# Altium schematic symbol library Maxim Sensors.SchLib: 1171 symbols (part 41 of 44) (continued)
## MAX11801EWC+ (continued)

## MAX11801EWC+T
designator U?
4 Channels, Ultra-Small, Low-Power, 4-Wire Touch-Sensor Controller with I2C Interface, -40 to 85 degC, 12-Pin BGA (W121A2+1), Pb-Free, Tape and Reel; Generic Part Number: MAX11801; PartNumber: MAX11801EWC+T; Channels: 4; Controller Type: Resistive; EV Kit: Yes; DatasheetVersion: Rev. 3; PackageVersion: Rev. G, 02/2010; PackageReference: W121A2+1; PackageDescription: 12-Pin Wafer-Level Package, Full Array, Body 1.555 x 2.135 mm, Pitch 0.5 mm; Supplier 1: Digi-Key; Supplier Part Number 1: MAX11801EWC+TTR-ND; Supplier 2: Digi-Key; Supplier Part Number 2: MAX11801EWC+TCT-ND; Supplier 3: Digi-Key; Supplier Part Number 3: MAX11801EWC+TDKR-ND; Supplier 4: Farnell; Supplier Part Number 4: 2071893; Supplier 5: Newark; Supplier Part Number 5: 69R7361; Supplier 6: Mouser; Supplier Part Number 6: 700-MAX11801EWC+T; Interface: I2C; Packing: Tape and Reel; Mounting Technology: Surface Mount; ComponentLink1Description: Manufacturer URL; ComponentLink1URL: http://www.maximintegrated.com/; ComponentLink2Description: Datasheet; ComponentLink2URL: http://datasheets.maximintegrated.com/en/ds/MAX11800-MAX11803.pdf; ComponentLink3Description: Package Specification; ComponentLink3URL: http://pdfserv.maximintegrated.com/package_dwgs/21-0009.PDF
footprint MAXM-W121A2+1 (BGA, 12-Balls, Body 2.135x1.555mm, Pitch 0.5mm)
pins: A1 A0 (in) "I2C Address Input Bit 0", A2 AUX (in) "Auxiliary Input", A3 Y+ (io) "Y+ Channel Input/Output", A4 X+ (io) "X+ Channel Input/Output", B1 SCL (in) "I2C Serial Data Clock Input", B2 A1 (in) "I2C Address Input Bit 1", B3 GND (power) "Ground", B4 VDD (power) "Power Supply. Bypass VDD to GND with a 1uF capacitor.", C1 SDA (io) "I2C Serial Data Bus Input/Output", C2 ~{TIRQ} (hiz) "Active-Low Touch Interrupt Output", C3 Y- (io) "Y- Channel Input/Output", C4 X- (io) "X- Channel Input/Output"

## MAX11801GTC/V+
designator U?
4 Channels, Ultra-Small, Low-Power, 4-Wire Touch-Sensor Controller with I2C Interface, -40 to 105 degC, 12-Pin QFN (T1244+4), Pb-Free; Generic Part Number: MAX11801; PartNumber: MAX11801GTC/V+; Channels: 4; Controller Type: Resistive; EV Kit: Yes; DatasheetVersion: Rev. 3; PackageVersion: Rev. L, 04/2012; PackageReference: T1244+4; PackageDescription: 12-Pin Thin Quad Flatpack, No Leads, Body 4 x 4 mm, Pitch 0.8 mm; Supplier 1: Digi-Key; Supplier Part Number 1: MAX11801GTC/V+-ND; Supplier 2: Mouser; Supplier Part Number 2: 700-MAX11801GTC/V+; Interface: I2C; Mounting Technology: Surface Mount; Code_JEDEC: MO-220; ComponentLink1Description: Manufacturer URL; ComponentLink1URL: http://www.maximintegrated.com/; ComponentLink2Description: Datasheet; ComponentLink2URL: http://datasheets.maximintegrated.com/en/ds/MAX11800-MAX11803.pdf; ComponentLink3Description: Package Specification; ComponentLink3URL: http://pdfserv.maximintegrated.com/package_dwgs/21-0139.PDF
footprint MAXM-T1244+4_N (QFN, 12-Leads, Body 4x4mm, Pitch 0.8mm, Thermal Pad 2.1x2.1mm, IPC Medium Density)
footprint MAXM-T1244+4_L (QFN, 12-Leads, Body 4x4mm, Pitch 0.8mm, Thermal Pad 2.1x2.1mm, IPC High Density)
footprint MAXM-T1244+4_M (QFN, 12-Leads, Body 4x4mm, Pitch 0.8mm, Thermal Pad 2.1x2.1mm, IPC Low Density)
pins: 1 X+ (io) "X+ Channel Input/Output", 2 VDD (power) "Power Supply. Bypass VDD to GND with a 1uF capacitor.", 3 GND (power) "Ground", 4 X- (io) "X- Channel Input/Output", 5 Y- (io) "Y- Channel Input/Output", 6 ~{TIRQ} (hiz) "Active-Low Touch Interrupt Output", 7 SDA (io) "I2C Serial Data Bus Input/Output", 8 SCL (in) "I2C Serial Data Clock Input", 9 A0 (in) "I2C Address Input Bit 0", 10 A1 (in) "I2C Address Input Bit 1", 11 AUX (in) "Auxiliary Input", 12 Y+ (io) "Y+ Channel Input/Output", 13 EP (power) "Exposed Pad (TQFN only). Connected to ground."

## MAX11801GTC/V+T
designator U?
4 Channels, Ultra-Small, Low-Power, 4-Wire Touch-Sensor Controller with I2C Interface, -40 to 105 degC, 12-Pin QFN (T1244+4), Pb-Free, Tape and Reel; Generic Part Number: MAX11801; PartNumber: MAX11801GTC/V+T; Channels: 4; Controller Type: Resistive; EV Kit: Yes; DatasheetVersion: Rev. 3; PackageVersion: Rev. L, 04/2012; PackageReference: T1244+4; PackageDescription: 12-Pin Thin Quad Flatpack, No Leads, Body 4 x 4 mm, Pitch 0.8 mm; Supplier 1: Digi-Key; Supplier Part Number 1: MAX11801GTC/V+T-ND; Supplier 2: Mouser; Supplier Part Number 2: 700-MAX11801GTC/V+T; Interface: I2C; Packing: Tape and Reel; Mounting Technology: Surface Mount; Code_JEDEC: MO-220; ComponentLink1Description: Manufacturer URL; ComponentLink1URL: http://www.maximintegrated.com/; ComponentLink2Description: Datasheet; ComponentLink2URL: http://datasheets.maximintegrated.com/en/ds/MAX11800-MAX11803.pdf; ComponentLink3Description: Package Specification; ComponentLink3URL: http://pdfserv.maximintegrated.com/package_dwgs/21-0139.PDF
footprint MAXM-T1244+4_N (QFN, 12-Leads, Body 4x4mm, Pitch 0.8mm, Thermal Pad 2.1x2.1mm, IPC Medium Density)
footprint MAXM-T1244+4_L (QFN, 12-Leads, Body 4x4mm, Pitch 0.8mm, Thermal Pad 2.1x2.1mm, IPC High Density)
footprint MAXM-T1244+4_M (QFN, 12-Leads, Body 4x4mm, Pitch 0.8mm, Thermal Pad 2.1x2.1mm, IPC Low Density)
pins: 1 X+ (io) "X+ Channel Input/Output", 2 VDD (power) "Power Supply. Bypass VDD to GND with a 1uF capacitor.", 3 GND (power) "Ground", 4 X- (io) "X- Channel Input/Output", 5 Y- (io) "Y- Channel Input/Output", 6 ~{TIRQ} (hiz) "Active-Low Touch Interrupt Output", 7 SDA (io) "I2C Serial Data Bus Input/Output", 8 SCL (in) "I2C Serial Data Clock Input", 9 A0 (in) "I2C Address Input Bit 0", 10 A1 (in) "I2C Address Input Bit 1", 11 AUX (in) "Auxiliary Input", 12 Y+ (io) "Y+ Channel Input/Output", 13 EP (power) "Exposed Pad (TQFN only). Connected to ground."

## MAX11802ETC+
designator U?
4 Channels, Low-Power, Ultra Small Resistive Touch-Screen Controller with SPI Interface, -40 to 85 degC, 12-Pin QFN (T1244+4), Pb-Free; Generic Part Number: MAX11802; PartNumber: MAX11802ETC+; Channels: 4; EV Kit: Yes; DatasheetVersion: Rev. 3; PackageVersion: Rev. L, 04/2012; PackageReference: T1244+4; PackageDescription: 12-Pin Thin Quad Flatpack, No Leads, Body 4 x 4 mm, Pitch 0.8 mm; Supplier 1: Digi-Key; Supplier Part Number 1: MAX11802ETC+-ND; Supplier 2: Farnell; Supplier Part Number 2: 2071378; Supplier 3: Newark; Supplier Part Number 3: 27R0848; Supplier 4: Mouser; Supplier Part Number 4: 700-MAX11802ETC+; Controller Type: Resistive; Interface: SPI; Mounting Technology: Surface Mount; Code_JEDEC: MO-220; ComponentLink1Description: Manufacturer URL; ComponentLink1URL: http://www.maximintegrated.com/; ComponentLink2Description: Datasheet; ComponentLink2URL: http://datasheets.maximintegrated.com/en/ds/MAX11800-MAX11803.pdf; ComponentLink3Description: Package Specification; ComponentLink3URL: http://pdfserv.maximintegrated.com/package_dwgs/21-0139.PDF
footprint MAXM-T1244+4_N (QFN, 12-Leads, Body 4x4mm, Pitch 0.8mm, Thermal Pad 2.1x2.1mm, IPC Medium Density)
footprint MAXM-T1244+4_L (QFN, 12-Leads, Body 4x4mm, Pitch 0.8mm, Thermal Pad 2.1x2.1mm, IPC High Density)
footprint MAXM-T1244+4_M (QFN, 12-Leads, Body 4x4mm, Pitch 0.8mm, Thermal Pad 2.1x2.1mm, IPC Low Density)
pins: 1 X+ (io) "X+ Channel Input/Output", 2 VDD (power) "Power Supply. Bypass VDD to GND with a 1uF capacitor.", 3 GND (power) "Ground", 4 X- (io) "X- Channel Input/Output", 5 Y- (io) "Y- Channel Input/Output", 6 ~{TIRQ} (hiz) "Active-Low Touch Interrupt Output", 7 DIN (in) "SPI Serial Data Input", 8 CLK (in) "SPI Serial Data Clock Input", 9 ~{CS} (in) "SPI Chip-Select Input", 10 DOUT (hiz) "SPI Data Output", 11 AUX (in) "Auxiliary Input", 12 Y+ (io) "Y+ Channel Input/Output", 13 EP (power) "Exposed Pad (TQFN only). Connected to ground."

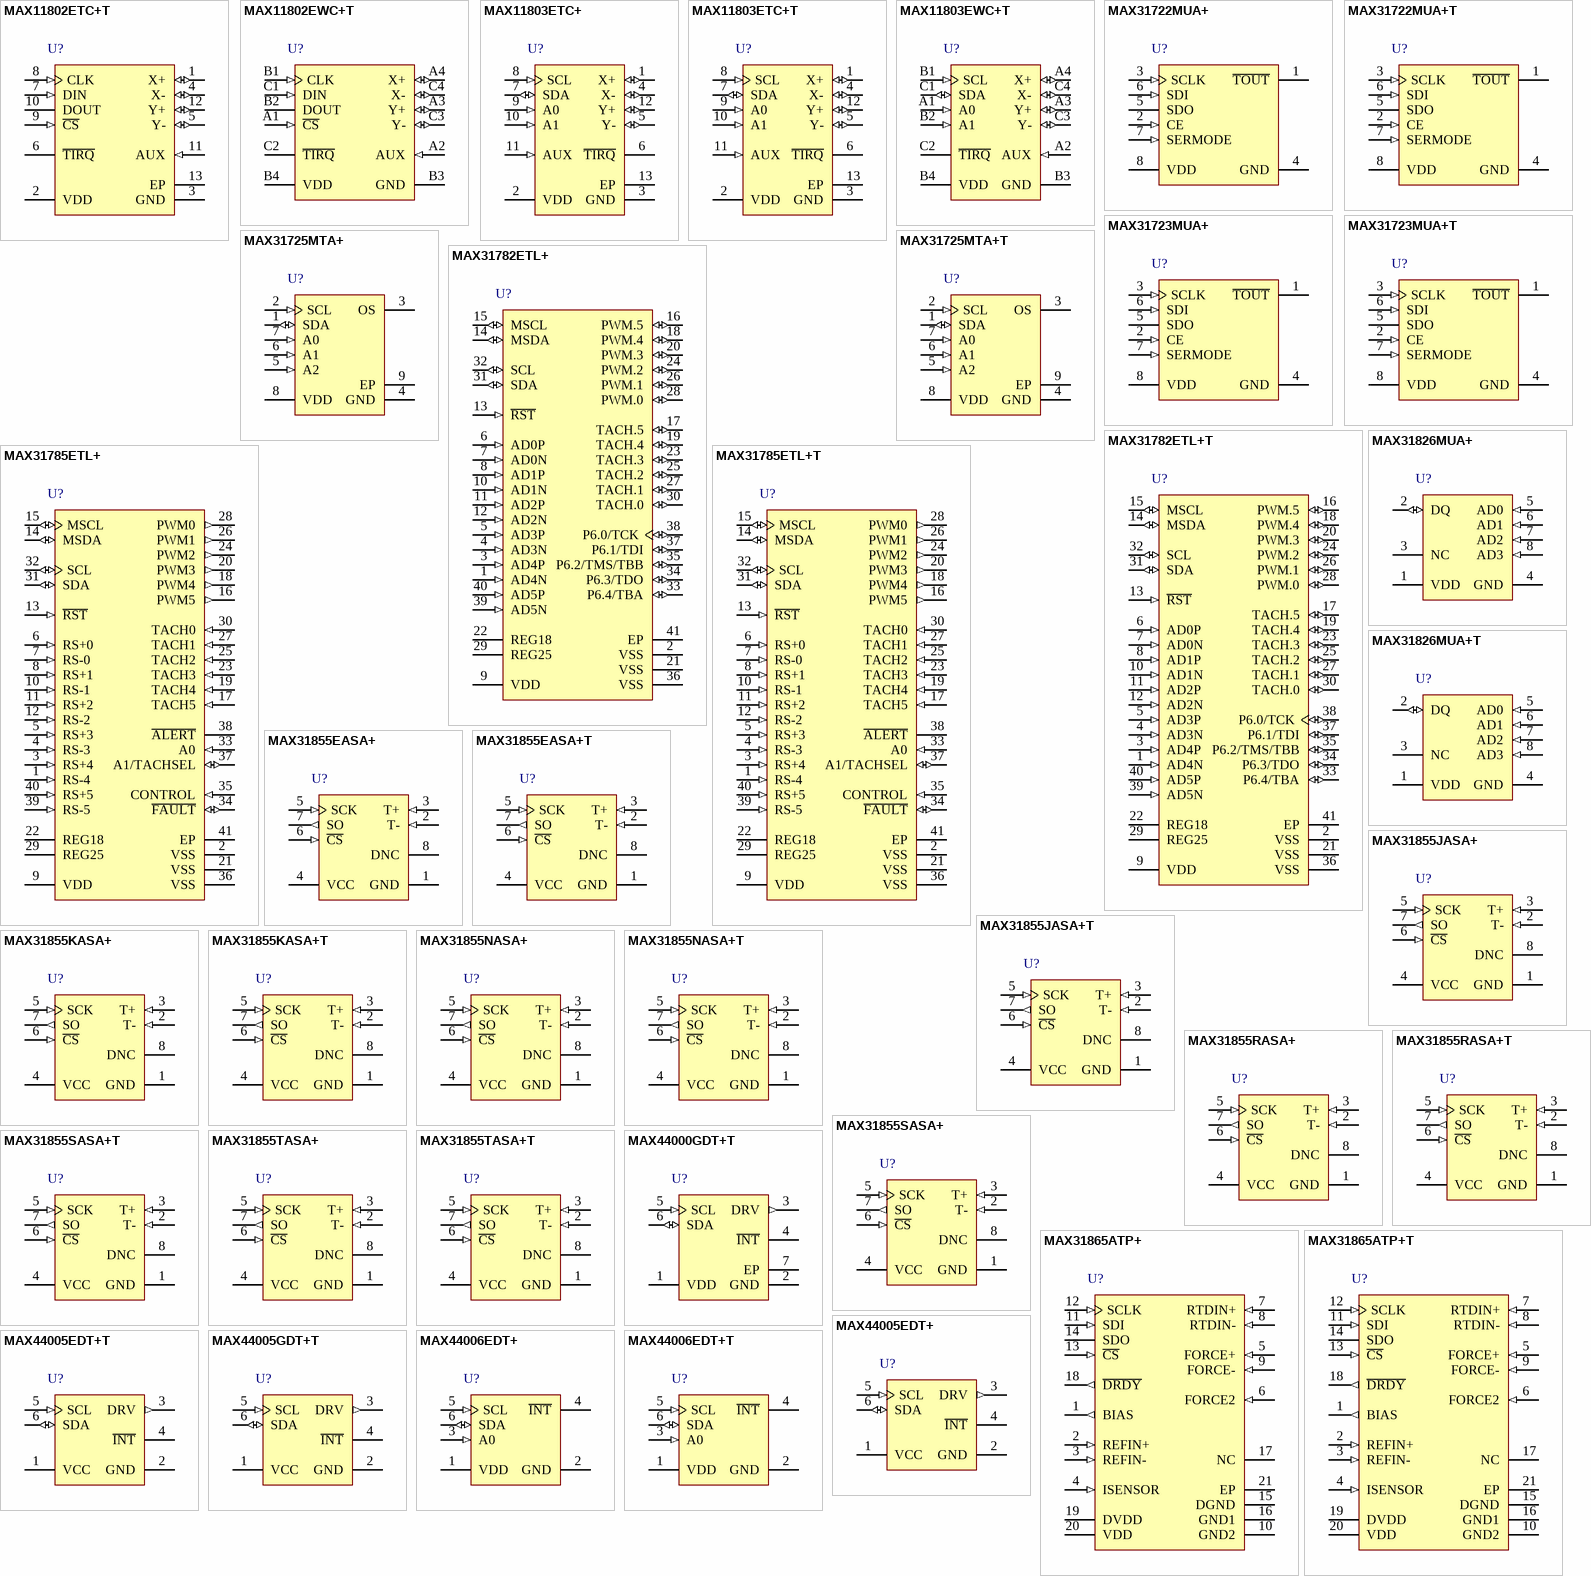
[diagram p31: symbols MAX11802ETC+T to MAX44006EDT+T]

## MAX11802ETC+T
designator U?
4 Channels, Low-Power, Ultra Small Resistive Touch-Screen Controller with SPI Interface, -40 to 85 degC, 12-Pin QFN (T1244+4), Pb-Free, Tape and Reel; Generic Part Number: MAX11802; PartNumber: MAX11802ETC+T; Channels: 4; EV Kit: Yes; DatasheetVersion: Rev. 3; PackageVersion: Rev. L, 04/2012; PackageReference: T1244+4; PackageDescription: 12-Pin Thin Quad Flatpack, No Leads, Body 4 x 4 mm, Pitch 0.8 mm; Supplier 1: Digi-Key; Supplier Part Number 1: MAX11802ETC+T-ND; Supplier 2: Mouser; Supplier Part Number 2: 700-MAX11802ETC+T; Controller Type: Resistive; Interface: SPI; Packing: Tape and Reel; Mounting Technology: Surface Mount; Code_JEDEC: MO-220; ComponentLink1Description: Manufacturer URL; ComponentLink1URL: http://www.maximintegrated.com/; ComponentLink2Description: Datasheet; ComponentLink2URL: http://datasheets.maximintegrated.com/en/ds/MAX11800-MAX11803.pdf; ComponentLink3Description: Package Specification; ComponentLink3URL: http://pdfserv.maximintegrated.com/package_dwgs/21-0139.PDF
footprint MAXM-T1244+4_N (QFN, 12-Leads, Body 4x4mm, Pitch 0.8mm, Thermal Pad 2.1x2.1mm, IPC Medium Density)
footprint MAXM-T1244+4_L (QFN, 12-Leads, Body 4x4mm, Pitch 0.8mm, Thermal Pad 2.1x2.1mm, IPC High Density)
footprint MAXM-T1244+4_M (QFN, 12-Leads, Body 4x4mm, Pitch 0.8mm, Thermal Pad 2.1x2.1mm, IPC Low Density)
pins: 1 X+ (io) "X+ Channel Input/Output", 2 VDD (power) "Power Supply. Bypass VDD to GND with a 1uF capacitor.", 3 GND (power) "Ground", 4 X- (io) "X- Channel Input/Output", 5 Y- (io) "Y- Channel Input/Output", 6 ~{TIRQ} (hiz) "Active-Low Touch Interrupt Output", 7 DIN (in) "SPI Serial Data Input", 8 CLK (in) "SPI Serial Data Clock Input", 9 ~{CS} (in) "SPI Chip-Select Input", 10 DOUT (hiz) "SPI Data Output", 11 AUX (in) "Auxiliary Input", 12 Y+ (io) "Y+ Channel Input/Output", 13 EP (power) "Exposed Pad (TQFN only). Connected to ground."

## MAX11802EWC+T
designator U?
4 Channels, Low-Power, Ultra Small Resistive Touch-Screen Controller with SPI Interface, -40 to 85 degC, 12-Pin BGA (W121A2+1), Pb-Free, Tape and Reel; Generic Part Number: MAX11802; PartNumber: MAX11802EWC+T; Channels: 4; EV Kit: Yes; DatasheetVersion: Rev. 3; PackageVersion: Rev. G, 02/2010; PackageReference: W121A2+1; PackageDescription: 12-Pin Wafer-Level Package, Full Array, Body 1.555 x 2.135 mm, Pitch 0.5 mm; Supplier 1: Digi-Key; Supplier Part Number 1: MAX11802EWC+TTR-ND; Supplier 2: Digi-Key; Supplier Part Number 2: MAX11802EWC+TCT-ND; Supplier 3: Digi-Key; Supplier Part Number 3: MAX11802EWC+TDKR-ND; Supplier 4: Newark; Supplier Part Number 4: 69R7362; Supplier 5: Mouser; Supplier Part Number 5: 700-MAX11802EWC+T; Controller Type: Resistive; Interface: SPI; Packing: Tape and Reel; Mounting Technology: Surface Mount; ComponentLink1Description: Manufacturer URL; ComponentLink1URL: http://www.maximintegrated.com/; ComponentLink2Description: Datasheet; ComponentLink2URL: http://datasheets.maximintegrated.com/en/ds/MAX11800-MAX11803.pdf; ComponentLink3Description: Package Specification; ComponentLink3URL: http://pdfserv.maximintegrated.com/package_dwgs/21-0009.PDF
footprint MAXM-W121A2+1 (BGA, 12-Balls, Body 2.135x1.555mm, Pitch 0.5mm)
pins: A1 ~{CS} (in) "SPI Chip-Select Input", A2 AUX (in) "Auxiliary Input", A3 Y+ (io) "Y+ Channel Input/Output", A4 X+ (io) "X+ Channel Input/Output", B1 CLK (in) "SPI Serial Data Clock Input", B2 DOUT (hiz) "SPI Data Output", B3 GND (power) "Ground", B4 VDD (power) "Power Supply. Bypass VDD to GND with a 1uF capacitor.", C1 DIN (in) "SPI Serial Data Input", C2 ~{TIRQ} (hiz) "Active-Low Touch Interrupt Output", C3 Y- (io) "Y- Channel Input/Output", C4 X- (io) "X- Channel Input/Output"

## MAX11803ETC+
designator U?
4 Channels, Low-Power, Ultra Small Resistive Touch-Screen Controller with SPI Interface, -40 to 85 degC, 12-Pin QFN (T1244+4), Pb-Free; Generic Part Number: MAX11803; PartNumber: MAX11803ETC+; Channels: 4; EV Kit: Yes; Interface: I2C; DatasheetVersion: Rev. 3; PackageVersion: Rev. L, 04/2012; PackageReference: T1244+4; PackageDescription: 12-Pin Thin Quad Flatpack, No Leads, Body 4 x 4 mm, Pitch 0.8 mm; Supplier 1: Digi-Key; Supplier Part Number 1: MAX11803ETC+-ND; Supplier 2: Farnell; Supplier Part Number 2: 2071379; Supplier 3: Newark; Supplier Part Number 3: 27R0851; Supplier 4: Mouser; Supplier Part Number 4: 700-MAX11803ETC+; Controller Type: Resistive; Mounting Technology: Surface Mount; Code_JEDEC: MO-220; ComponentLink1Description: Manufacturer URL; ComponentLink1URL: http://www.maximintegrated.com/; ComponentLink2Description: Datasheet; ComponentLink2URL: http://datasheets.maximintegrated.com/en/ds/MAX11800-MAX11803.pdf; ComponentLink3Description: Package Specification; ComponentLink3URL: http://pdfserv.maximintegrated.com/package_dwgs/21-0139.PDF
footprint MAXM-T1244+4_N (QFN, 12-Leads, Body 4x4mm, Pitch 0.8mm, Thermal Pad 2.1x2.1mm, IPC Medium Density)
footprint MAXM-T1244+4_L (QFN, 12-Leads, Body 4x4mm, Pitch 0.8mm, Thermal Pad 2.1x2.1mm, IPC High Density)
footprint MAXM-T1244+4_M (QFN, 12-Leads, Body 4x4mm, Pitch 0.8mm, Thermal Pad 2.1x2.1mm, IPC Low Density)
pins: 1 X+ (io) "X+ Channel Input/Output", 2 VDD (power) "Power Supply. Bypass VDD to GND with a 1uF capacitor.", 3 GND (power) "Ground", 4 X- (io) "X- Channel Input/Output", 5 Y- (io) "Y- Channel Input/Output", 6 ~{TIRQ} (hiz) "Active-Low Touch Interrupt Output", 7 SDA (io) "I2C Serial Data Bus Input/Output", 8 SCL (in) "I2C Serial Data Clock Input", 9 A0 (in) "I2C Address Input Bit 0", 10 A1 (in) "I2C Address Input Bit 1", 11 AUX (in) "Auxiliary Input", 12 Y+ (io) "Y+ Channel Input/Output", 13 EP (power) "Exposed Pad (TQFN only). Connected to ground."

## MAX11803ETC+T
designator U?
4 Channels, Low-Power, Ultra Small Resistive Touch-Screen Controller with SPI Interface, -40 to 85 degC, 12-Pin QFN (T1244+4), Pb-Free, Tape and Reel; Generic Part Number: MAX11803; PartNumber: MAX11803ETC+T; Channels: 4; EV Kit: Yes; Interface: I2C; DatasheetVersion: Rev. 3; PackageVersion: Rev. L, 04/2012; PackageReference: T1244+4; PackageDescription: 12-Pin Thin Quad Flatpack, No Leads, Body 4 x 4 mm, Pitch 0.8 mm; Supplier 1: Digi-Key; Supplier Part Number 1: MAX11803ETC+T-ND; Supplier 2: Mouser; Supplier Part Number 2: 700-MAX11803ETC+T; Controller Type: Resistive; Packing: Tape and Reel; Mounting Technology: Surface Mount; Code_JEDEC: MO-220; ComponentLink1Description: Manufacturer URL; ComponentLink1URL: http://www.maximintegrated.com/; ComponentLink2Description: Datasheet; ComponentLink2URL: http://datasheets.maximintegrated.com/en/ds/MAX11800-MAX11803.pdf; ComponentLink3Description: Package Specification; ComponentLink3URL: http://pdfserv.maximintegrated.com/package_dwgs/21-0139.PDF
footprint MAXM-T1244+4_N (QFN, 12-Leads, Body 4x4mm, Pitch 0.8mm, Thermal Pad 2.1x2.1mm, IPC Medium Density)
footprint MAXM-T1244+4_L (QFN, 12-Leads, Body 4x4mm, Pitch 0.8mm, Thermal Pad 2.1x2.1mm, IPC High Density)
footprint MAXM-T1244+4_M (QFN, 12-Leads, Body 4x4mm, Pitch 0.8mm, Thermal Pad 2.1x2.1mm, IPC Low Density)
pins: 1 X+ (io) "X+ Channel Input/Output", 2 VDD (power) "Power Supply. Bypass VDD to GND with a 1uF capacitor.", 3 GND (power) "Ground", 4 X- (io) "X- Channel Input/Output", 5 Y- (io) "Y- Channel Input/Output", 6 ~{TIRQ} (hiz) "Active-Low Touch Interrupt Output", 7 SDA (io) "I2C Serial Data Bus Input/Output", 8 SCL (in) "I2C Serial Data Clock Input", 9 A0 (in) "I2C Address Input Bit 0", 10 A1 (in) "I2C Address Input Bit 1", 11 AUX (in) "Auxiliary Input", 12 Y+ (io) "Y+ Channel Input/Output", 13 EP (power) "Exposed Pad (TQFN only). Connected to ground."

## MAX11803EWC+T
designator U?
4 Channels, Low-Power, Ultra Small Resistive Touch-Screen Controller with SPI Interface, -40 to 85 degC, 12-Pin BGA (W121A2+1), Pb-Free, Tape and Reel; Generic Part Number: MAX11803; PartNumber: MAX11803EWC+T; Channels: 4; EV Kit: Yes; Interface: I2C; DatasheetVersion: Rev. 3; PackageVersion: Rev. G, 02/2010; PackageReference: W121A2+1; PackageDescription: 12-Pin Wafer-Level Package, Full Array, Body 1.555 x 2.135 mm, Pitch 0.5 mm; Supplier 1: Digi-Key; Supplier Part Number 1: MAX11803EWC+TTR-ND; Supplier 2: Digi-Key; Supplier Part Number 2: MAX11803EWC+TCT-ND; Supplier 3: Digi-Key; Supplier Part Number 3: MAX11803EWC+TDKR-ND; Supplier 4: Newark; Supplier Part Number 4: 69R7363; Supplier 5: Mouser; Supplier Part Number 5: 700-MAX11803EWC+T; Controller Type: Resistive; Packing: Tape and Reel; Mounting Technology: Surface Mount; ComponentLink1Description: Manufacturer URL; ComponentLink1URL: http://www.maximintegrated.com/; ComponentLink2Description: Datasheet; ComponentLink2URL: http://datasheets.maximintegrated.com/en/ds/MAX11800-MAX11803.pdf; ComponentLink3Description: Package Specification; ComponentLink3URL: http://pdfserv.maximintegrated.com/package_dwgs/21-0009.PDF
footprint MAXM-W121A2+1 (BGA, 12-Balls, Body 2.135x1.555mm, Pitch 0.5mm)
pins: A1 A0 (in) "I2C Address Input Bit 0", A2 AUX (in) "Auxiliary Input", A3 Y+ (io) "Y+ Channel Input/Output", A4 X+ (io) "X+ Channel Input/Output", B1 SCL (in) "I2C Serial Data Clock Input", B2 A1 (in) "I2C Address Input Bit 1", B3 GND (power) "Ground", B4 VDD (power) "Power Supply. Bypass VDD to GND with a 1uF capacitor.", C1 SDA (io) "I2C Serial Data Bus Input/Output", C2 ~{TIRQ} (hiz) "Active-Low Touch Interrupt Output", C3 Y- (io) "Y- Channel Input/Output", C4 X- (io) "X- Channel Input/Output"

## MAX31722MUA+
designator U?
Digital Thermometers and Thermostats with SPI / 3-Wire Interface, 12 Bits Temperature Resolution, -55 to 125 degC, 8-Pin SOP (U8+1), Pb-Free; Generic Part Number: MAX31722; PartNumber: MAX31722MUA+; Alarm Output: Overt; Functions: Memory, Single Temperature Alarm ,Standalone Thermostat; Interface: 3-Wire/SPI, 3-Wire; Parasite Pwr.: No; DatasheetVersion: Rev. 0; PackageVersion: Rev. L, 08/2009; PackageReference: U8+1; PackageDescription: 8-Pin Micro-MAX, Thin Shrink Small-Outline (U8+1), Body 3 x 3 mm, Pitch 0.65 mm; Supplier 1: Digi-Key; Supplier Part Number 1: MAX31722MUA+-ND; Supplier 2: Farnell; Supplier Part Number 2: 2212248; Supplier 3: Newark; Supplier Part Number 3: 45W6313; Supplier 4: Mouser; Supplier Part Number 4: 700-MAX31722MUA+; Mounting Technology: Surface Mount; Code_JEDEC: MO-187; ComponentLink1Description: Manufacturer URL; ComponentLink1URL: http://www.maximintegrated.com/; ComponentLink2Description: Datasheet; ComponentLink2URL: http://datasheets.maximintegrated.com/en/ds/MAX31722-MAX31723.pdf; ComponentLink3Description: Package Specification; ComponentLink3URL: http://pdfserv.maximintegrated.com/package_dwgs/21-0036.PDF
footprint MAXM-U8+1_N (SOP, 8-Leads, Body 3x3mm, Pitch 0.65mm, IPC Medium Density)
footprint MAXM-U8+1_L (SOP, 8-Leads, Body 3x3mm, Pitch 0.65mm, IPC High Density)
footprint MAXM-U8+1_M (SOP, 8-Leads, Body 3x3mm, Pitch 0.65mm, IPC Low Density)
pins: 1 ~{TOUT} (oc) "Thermostat Output. Open-drain output indicator for internal thermal alarm limits.", 2 CE (in) "Chip Enable. Must be asserted high for communication to take place for either the SPI or 3-wire interfaces.", 3 SCLK (in) "Serial-Clock Input. Used to synchronize data movement on the serial interface for either SPI or 3-wire interfaces.", 4 GND (power) "Ground. Ground connection.", 5 SDO (hiz) "Serial-Data Output. When SPI communication is selected, the SDO pin is the serial-data output for the SPI bus. When 3-wire communication is selected, this pin must be connected to the SDI pin. The SDI and SDO pins function (See Datasheet)", 6 SDI (in) "Serial-Data Input. When SPI communication is selected, the SDI pin is the serial-data input for the SPI bus. When 3-wire communication is selected, this pin must be connected to the SDO pin. The SDI and SDO pins function as (See Datasheet)", 7 SERMODE (in) "Serial-Interface Mode Input. This pin selects which interface is used. When connected to VDD, SPI communication is selected. When connected to GND, 3-wire communication is selected.", 8 VDD (power) "Supply Voltage. Power-supply input."

## MAX31722MUA+T
designator U?
Digital Thermometers and Thermostats with SPI / 3-Wire Interface, 12 Bits Temperature Resolution, -55 to 125 degC, 8-Pin SOP (U8+1), Pb-Free, Tape and Reel; Generic Part Number: MAX31722; PartNumber: MAX31722MUA+T; Alarm Output: Overt; Functions: Memory, Single Temperature Alarm ,Standalone Thermostat; Interface: 3-Wire/SPI, 3-Wire; Parasite Pwr.: No; DatasheetVersion: Rev. 0; PackageVersion: Rev. L, 08/2009; PackageReference: U8+1; PackageDescription: 8-Pin Micro-MAX, Thin Shrink Small-Outline (U8+1), Body 3 x 3 mm, Pitch 0.65 mm; Supplier 1: Digi-Key; Supplier Part Number 1: MAX31722MUA+TTR-ND; Supplier 2: Digi-Key; Supplier Part Number 2: MAX31722MUA+TCT-ND; Supplier 3: Digi-Key; Supplier Part Number 3: MAX31722MUA+TDKR-ND; Supplier 4: Mouser; Supplier Part Number 4: 700-MAX31722MUA+T; Packing: Tape and Reel; Mounting Technology: Surface Mount; Code_JEDEC: MO-187; ComponentLink1Description: Manufacturer URL; ComponentLink1URL: http://www.maximintegrated.com/; ComponentLink2Description: Datasheet; ComponentLink2URL: http://datasheets.maximintegrated.com/en/ds/MAX31722-MAX31723.pdf; ComponentLink3Description: Package Specification; ComponentLink3URL: http://pdfserv.maximintegrated.com/package_dwgs/21-0036.PDF
footprint MAXM-U8+1_N (SOP, 8-Leads, Body 3x3mm, Pitch 0.65mm, IPC Medium Density)
footprint MAXM-U8+1_L (SOP, 8-Leads, Body 3x3mm, Pitch 0.65mm, IPC High Density)
footprint MAXM-U8+1_M (SOP, 8-Leads, Body 3x3mm, Pitch 0.65mm, IPC Low Density)
pins: 1 ~{TOUT} (oc) "Thermostat Output. Open-drain output indicator for internal thermal alarm limits.", 2 CE (in) "Chip Enable. Must be asserted high for communication to take place for either the SPI or 3-wire interfaces.", 3 SCLK (in) "Serial-Clock Input. Used to synchronize data movement on the serial interface for either SPI or 3-wire interfaces.", 4 GND (power) "Ground. Ground connection.", 5 SDO (hiz) "Serial-Data Output. When SPI communication is selected, the SDO pin is the serial-data output for the SPI bus. When 3-wire communication is selected, this pin must be connected to the SDI pin. The SDI and SDO pins function (See Datasheet)", 6 SDI (in) "Serial-Data Input. When SPI communication is selected, the SDI pin is the serial-data input for the SPI bus. When 3-wire communication is selected, this pin must be connected to the SDO pin. The SDI and SDO pins function as (See Datasheet)", 7 SERMODE (in) "Serial-Interface Mode Input. This pin selects which interface is used. When connected to VDD, SPI communication is selected. When connected to GND, 3-wire communication is selected.", 8 VDD (power) "Supply Voltage. Power-supply input."

## MAX31723MUA+
designator U?
Digital Thermometers and Thermostats with SPI / 3-Wire Interface, 12 Bits Temperature Resolution, -55 to 125 degC, 8-Pin SOP (U8+1), Pb-Free; Generic Part Number: MAX31723; PartNumber: MAX31723MUA+; Alarm Output: Overt; Functions: Memory, Single Temperature Alarm ,Standalone Thermostat; Interface: 3-Wire/SPI, 3-Wire; Parasite Pwr.: No; DatasheetVersion: Rev. 0; PackageVersion: Rev. L, 08/2009; PackageReference: U8+1; PackageDescription: 8-Pin Micro-MAX, Thin Shrink Small-Outline (U8+1), Body 3 x 3 mm, Pitch 0.65 mm; Supplier 1: Digi-Key; Supplier Part Number 1: MAX31723MUA+-ND; Supplier 2: Farnell; Supplier Part Number 2: 2212251; Supplier 3: Newark; Supplier Part Number 3: 45W6314; Supplier 4: Mouser; Supplier Part Number 4: 700-MAX31723MUA+; Mounting Technology: Surface Mount; Code_JEDEC: MO-187; ComponentLink1Description: Manufacturer URL; ComponentLink1URL: http://www.maximintegrated.com/; ComponentLink2Description: Datasheet; ComponentLink2URL: http://datasheets.maximintegrated.com/en/ds/MAX31722-MAX31723.pdf; ComponentLink3Description: Package Specification; ComponentLink3URL: http://pdfserv.maximintegrated.com/package_dwgs/21-0036.PDF
footprint MAXM-U8+1_N (SOP, 8-Leads, Body 3x3mm, Pitch 0.65mm, IPC Medium Density)
footprint MAXM-U8+1_L (SOP, 8-Leads, Body 3x3mm, Pitch 0.65mm, IPC High Density)
footprint MAXM-U8+1_M (SOP, 8-Leads, Body 3x3mm, Pitch 0.65mm, IPC Low Density)
pins: 1 ~{TOUT} (oc) "Thermostat Output. Open-drain output indicator for internal thermal alarm limits.", 2 CE (in) "Chip Enable. Must be asserted high for communication to take place for either the SPI or 3-wire interfaces.", 3 SCLK (in) "Serial-Clock Input. Used to synchronize data movement on the serial interface for either SPI or 3-wire interfaces.", 4 GND (power) "Ground. Ground connection.", 5 SDO (hiz) "Serial-Data Output. When SPI communication is selected, the SDO pin is the serial-data output for the SPI bus. When 3-wire communication is selected, this pin must be connected to the SDI pin. The SDI and SDO pins function (See Datasheet)", 6 SDI (in) "Serial-Data Input. When SPI communication is selected, the SDI pin is the serial-data input for the SPI bus. When 3-wire communication is selected, this pin must be connected to the SDO pin. The SDI and SDO pins function as (See Datasheet)", 7 SERMODE (in) "Serial-Interface Mode Input. This pin selects which interface is used. When connected to VDD, SPI communication is selected. When connected to GND, 3-wire communication is selected.", 8 VDD (power) "Supply Voltage. Power-supply input."

## MAX31723MUA+T
designator U?
Digital Thermometers and Thermostats with SPI / 3-Wire Interface, 12 Bits Temperature Resolution, -55 to 125 degC, 8-Pin SOP (U8+1), Pb-Free, Tape ang Reel; Generic Part Number: MAX31723; PartNumber: MAX31723MUA+T; Alarm Output: Overt; Functions: Memory, Single Temperature Alarm ,Standalone Thermostat; Interface: 3-Wire/SPI, 3-Wire; Parasite Pwr.: No; DatasheetVersion: Rev. 0; PackageVersion: Rev. L, 08/2009; PackageReference: U8+1; PackageDescription: 8-Pin Micro-MAX, Thin Shrink Small-Outline (U8+1), Body 3 x 3 mm, Pitch 0.65 mm; Supplier 1: Digi-Key; Supplier Part Number 1: MAX31723MUA+TTR-ND; Supplier 2: Digi-Key; Supplier Part Number 2: MAX31723MUA+TCT-ND; Supplier 3: Digi-Key; Supplier Part Number 3: MAX31723MUA+TDKR-ND; Supplier 4: Mouser; Supplier Part Number 4: 700-MAX31723MUA+T; Packing: Tape ang Reel; Mounting Technology: Surface Mount; Code_JEDEC: MO-187; ComponentLink1Description: Manufacturer URL; ComponentLink1URL: http://www.maximintegrated.com/; ComponentLink2Description: Datasheet; ComponentLink2URL: http://datasheets.maximintegrated.com/en/ds/MAX31722-MAX31723.pdf; ComponentLink3Description: Package Specification; ComponentLink3URL: http://pdfserv.maximintegrated.com/package_dwgs/21-0036.PDF
footprint MAXM-U8+1_N (SOP, 8-Leads, Body 3x3mm, Pitch 0.65mm, IPC Medium Density)
footprint MAXM-U8+1_L (SOP, 8-Leads, Body 3x3mm, Pitch 0.65mm, IPC High Density)
footprint MAXM-U8+1_M (SOP, 8-Leads, Body 3x3mm, Pitch 0.65mm, IPC Low Density)
pins: 1 ~{TOUT} (oc) "Thermostat Output. Open-drain output indicator for internal thermal alarm limits.", 2 CE (in) "Chip Enable. Must be asserted high for communication to take place for either the SPI or 3-wire interfaces.", 3 SCLK (in) "Serial-Clock Input. Used to synchronize data movement on the serial interface for either SPI or 3-wire interfaces.", 4 GND (power) "Ground. Ground connection.", 5 SDO (hiz) "Serial-Data Output. When SPI communication is selected, the SDO pin is the serial-data output for the SPI bus. When 3-wire communication is selected, this pin must be connected to the SDI pin. The SDI and SDO pins function (See Datasheet)", 6 SDI (in) "Serial-Data Input. When SPI communication is selected, the SDI pin is the serial-data input for the SPI bus. When 3-wire communication is selected, this pin must be connected to the SDO pin. The SDI and SDO pins function as (See Datasheet)", 7 SERMODE (in) "Serial-Interface Mode Input. This pin selects which interface is used. When connected to VDD, SPI communication is selected. When connected to GND, 3-wire communication is selected.", 8 VDD (power) "Supply Voltage. Power-supply input."

## MAX31725MTA+
designator U?
+ / -0.5 degC Local I2C Temperature Sensor, 16 Bits Temperature Resolution, -55 to 150 degC, 8-Pin SON (T833+2), Pb-Free; Generic Part Number: MAX31725; PartNumber: MAX31725MTA+; Alarm Output: Overt; Interface: 2-Wire/I2C/SMBus; Multi Droppable: Yes; Parasite Pwr.: No; DatasheetVersion: Rev. 0; PackageVersion: Rev. J, 08/2009; PackageReference: T833+2; PackageDescription: 8-Pin Plastic Very Very Thin Dual Flatpack No Leads, Exposed Pad (T833+2); Supplier 1: Digi-Key; Supplier Part Number 1: MAX31725MTA+-ND; Supplier 2: Mouser; Supplier Part Number 2: 700-MAX31725MTA+; Mounting Technology: Surface Mount; Code_JEDEC: MO229; ComponentLink1Description: Manufacturer URL; ComponentLink1URL: http://www.maximintegrated.com/; ComponentLink2Description: Datasheet; ComponentLink2URL: http://datasheets.maximintegrated.com/en/ds/MAX31725.pdf; ComponentLink3Description: Package Specification; ComponentLink3URL: http://pdfserv.maximintegrated.com/package_dwgs/21-0137.PDF
footprint MAXM-T833+2_V (SON, 8-Leads, Body 3x3 mm, Pitch 0.65mm, Thermal Pad 2.3x1.5mm)
pins: 1 SDA (io) "Serial-Data Input/Output Line. Open drain. Connect SDA to a pullup resistor. High impedance for supply voltages from 0 to 3.7V.", 2 SCL (in) "Serial-Data Clock Input. Open drain. Connect SCL to a pullup resistor. High impedance for supply voltages from 0 to 3.7V.", 3 OS (oc) "Overtemperature Shutdown Output. Open drain. Connect OS to a pullup resistor.", 4 GND (power) "Ground", 5 A2 (in) "I2C Slave Address Input. Connect A2 to GND or VDD to set the desired I2C bus address. Do not leave unconnected (Table 1).", 6 A1 (in) "I2C Slave Address Input. Connect A1 to GND, VDD, SDA, or SCL to set the desired I2C bus address. Do not leave unconnected (Table 1). High impedance for supply voltages from 0 to 3.7V.", 7 A0 (in) "I2C Slave Address Input. Connect A0 to GND, VDD, SDA, or SCL to set the desired I2C bus address. Do not leave unconnected (Table 1). High impedance for supply voltages from 0 to 3.7V.", 8 VDD (power) "Positive Supply Voltage Input. Bypass to GND with a 0.1uF bypass capacitor.", 9 EP (power) "Exposed Pad (Bottom Side of Package). Connect EP to GND."

## MAX31725MTA+T
designator U?
+ / -0.5 degC Local I2C Temperature Sensor, 16 Bits Temperature Resolution, -55 to 125 degC, 8-Pin SON (T833+2), Pb-Free, Tape and Reel; Generic Part Number: MAX31725; PartNumber: MAX31725MTA+T; Alarm Output: Overt; Interface: 2-Wire/I2C/SMBus; Multi Droppable: Yes; Parasite Pwr.: No; DatasheetVersion: Rev. 0; PackageVersion: Rev. J, 08/2009; PackageReference: T833+2; PackageDescription: 8-Pin Plastic Very Very Thin Dual Flatpack No Leads, Exposed Pad (T833+2); Supplier 1: Digi-Key; Supplier Part Number 1: MAX31725MTA+T-ND; Supplier 2: Mouser; Supplier Part Number 2: 700-MAX31725MTA+T; Packing: Tape and Reel; Mounting Technology: Surface Mount; Code_JEDEC: MO229; ComponentLink1Description: Manufacturer URL; ComponentLink1URL: http://www.maximintegrated.com/; ComponentLink2Description: Datasheet; ComponentLink2URL: http://datasheets.maximintegrated.com/en/ds/MAX31725.pdf; ComponentLink3Description: Package Specification; ComponentLink3URL: http://pdfserv.maximintegrated.com/package_dwgs/21-0137.PDF
footprint MAXM-T833+2_V (SON, 8-Leads, Body 3x3 mm, Pitch 0.65mm, Thermal Pad 2.3x1.5mm)
pins: 1 SDA (io) "Serial-Data Input/Output Line. Open drain. Connect SDA to a pullup resistor. High impedance for supply voltages from 0 to 3.7V.", 2 SCL (in) "Serial-Data Clock Input. Open drain. Connect SCL to a pullup resistor. High impedance for supply voltages from 0 to 3.7V.", 3 OS (oc) "Overtemperature Shutdown Output. Open drain. Connect OS to a pullup resistor.", 4 GND (power) "Ground", 5 A2 (in) "I2C Slave Address Input. Connect A2 to GND or VDD to set the desired I2C bus address. Do not leave unconnected (Table 1).", 6 A1 (in) "I2C Slave Address Input. Connect A1 to GND, VDD, SDA, or SCL to set the desired I2C bus address. Do not leave unconnected (Table 1). High impedance for supply voltages from 0 to 3.7V.", 7 A0 (in) "I2C Slave Address Input. Connect A0 to GND, VDD, SDA, or SCL to set the desired I2C bus address. Do not leave unconnected (Table 1). High impedance for supply voltages from 0 to 3.7V.", 8 VDD (power) "Positive Supply Voltage Input. Bypass to GND with a 0.1uF bypass capacitor.", 9 EP (power) "Exposed Pad (Bottom Side of Package). Connect EP to GND."

## MAX31782ETL+
designator U?
System Management Microcontroller, -40 to 85 degC, 40-Pin QFN (T4066+2), Pb-Free; Generic Part Number: MAX31782; PartNumber: MAX31782ETL+; Fan Cntrl.: PWM; Fan Controller Functions: Fan Failure Detector, Remote & Local Sensor; Interface: 2-Wire/I2C/SMBus, JTAG; DatasheetVersion: Rev. 2; PackageVersion: Rev. M, 03/2012; PackageReference: T4066+2; PackageDescription: 40-Pin Thin Quad Flatpack, No Leads, Body 6 x 6 mm, Pitch 0.5 mm; Supplier 1: Digi-Key; Supplier Part Number 1: MAX31782ETL+-ND; Supplier 2: Mouser; Supplier Part Number 2: 700-MAX31782ETL+; Mounting Technology: Surface Mount; Code_JEDEC: MO-220; ComponentLink1Description: Manufacturer URL; ComponentLink1URL: http://www.maximintegrated.com/; ComponentLink2Description: Datasheet; ComponentLink2URL: http://datasheets.maximintegrated.com/en/ds/MAX31782.pdf; ComponentLink3Description: Package Specification; ComponentLink3URL: http://pdfserv.maximintegrated.com/package_dwgs/21-0141.PDF
footprint MAXM-T4066+2_N (QFN, 40-Leads, Body 6x6mm, Pitch 0.5mm, Thermal Pad 4.1x4.1mm, IPC Medium Density)
footprint MAXM-T4066+2_L (QFN, 40-Leads, Body 6x6mm, Pitch 0.5mm, Thermal Pad 4.1x4.1mm, IPC High Density)
footprint MAXM-T4066+2_M (QFN, 40-Leads, Body 6x6mm, Pitch 0.5mm, Thermal Pad 4.1x4.1mm, IPC Low Density)
pins: 1 AD4N (in) "Ground Reference for ADC.4 Voltage Measurement", 2 VSS (power) "Supply Return Node", 3 AD4P (in) "ADC Voltage-Sense Input, Measurement Relative to AD4N", 4 AD3N (in) "Ground Reference for ADC.3 Voltage Measurement. Connected to external reference pin when enabled.", 5 AD3P (in) "ADC Voltage-Sense Input, Measurement Relative to AD3N", 6 AD0P (in) "ADC Voltage-Sense Input, Measurement Relative to AD0N", 7 AD0N (in) "Ground Reference for ADC.0 Voltage Measurement", 8 AD1P (in) "ADC Voltage-Sense Input, Measurement Relative to AD1N", 9 VDD (power) "Input Supply. +2.7V to +5.5V input range. Bypass VDD to VSS with a 0.1uF capacitor.", 10 AD1N (in) "Ground Reference for ADC.1 Voltage Measurement", 11 AD2P (in) "ADC Voltage-Sense Input, Measurement Relative to AD2N", 12 AD2N (in) "Ground Reference for ADC.2 Voltage Measurement", 13 ~{RST} (in) "Active-Low Reset. A low-level voltage at this pin resets the IC.", 14 MSDA (io) "Master I2C-Compatible Bidirectional Data Line. When disabled, this pin can be used as GPIO P2.7.", 15 MSCL (io) "Master I2C-Compatible Clock. When disabled, this pin can be used as GPIO P2.6.", 16 PWM.5 (io) "PWM Output No. 5. When disabled, this pin can be used as GPIO.", 17 TACH.5 (io) "Tachometer Input No. 5. When disabled, this pin can be used as GPIO.", 18 PWM.4 (io) "PWM Output No. 4. When disabled, this pin can be used as GPIO.", 19 TACH.4 (io) "Tachometer Input No. 4. When disabled, this pin can be used as GPIO.", 20 PWM.3 (io) "PWM Output No. 3. When disabled, this pin can be used as GPIO.", 21 VSS (power) "Supply Return Node", 22 REG18 "Bypass REG18 to VSS with 1uF and high-frequency 10nF capacitors. Do not use for external circuitry.", 23 TACH.3 (io) "Tachometer Input No. 3. When disabled, this pin can be used as GPIO.", 24 PWM.2 (io) "PWM Output No. 2. When disabled, this pin can be used as GPIO.", 25 TACH.2 (io) "Tachometer Input No. 2. When disabled, this pin can be used as GPIO.", 26 PWM.1 (io) "PWM Output No. 1. When disabled, this pin can be used as GPIO.", 27 TACH.1 (io) "Tachometer Input No. 1. When disabled, this pin can be used as GPIO.", 28 PWM.0 (io) "PWM Output No. 0. When disabled, this pin can be used as GPIO.", 29 REG25 "Bypass REG25 to VSS with 1FF and high-frequency 10nF capacitors. Do not use for external circuitry.", 30 TACH.0 (io) "Tachometer Input No. 0. When disabled, this pin can be used as GPIO.", 31 SDA (io) "Slave I2C-Compatible Bidirectional Data Line. When disabled, this pin can be used as GPIO.", 32 SCL (io) "Slave I2C-Compatible Clock. When disabled, this pin can be used as GPIO.", 33 P6.4/TBA (io) "Programmable I/O Pin. Alternate function: Timer/Counter TBA", 34 P6.3/TDO (io) "Programmable I/O Pin. Alternate function: JTAG TDO", 35 P6.2/TMS/TBB (io) "Programmable I/O Pin. Alternate functions: Timer/Counter TBB, JTAG TMS", 36 VSS (power) "Supply Return Node", 37 P6.1/TDI (io) "Programmable I/O Pin. Alternate function: JTAG TDI", 38 P6.0/TCK (io) "Programmable I/O Pin. Alternate function: JTAG TCK", 39 AD5N (in) "Ground Reference for ADC.5 Voltage Measurement", 40 AD5P (in) "ADC Voltage-Sense Input, Measurement Relative to AD5N", 41 EP (power) "Exposed Pad. Not electrically connected to IC. Connect to VSS."